# Altium footprint library Lib_Global.PcbLib: 96 footprints (part 6 of 6)
Each footprint in its own frame and in the unit in brackets; x right, y up, seen from the top. Pads: shape width x height; smd on the part's side, far side on the other; paste and mask are expansions set on the pad; w line width, h text height; cw(c..) or ccw(c..) is an arc to the next point about the centre after c.
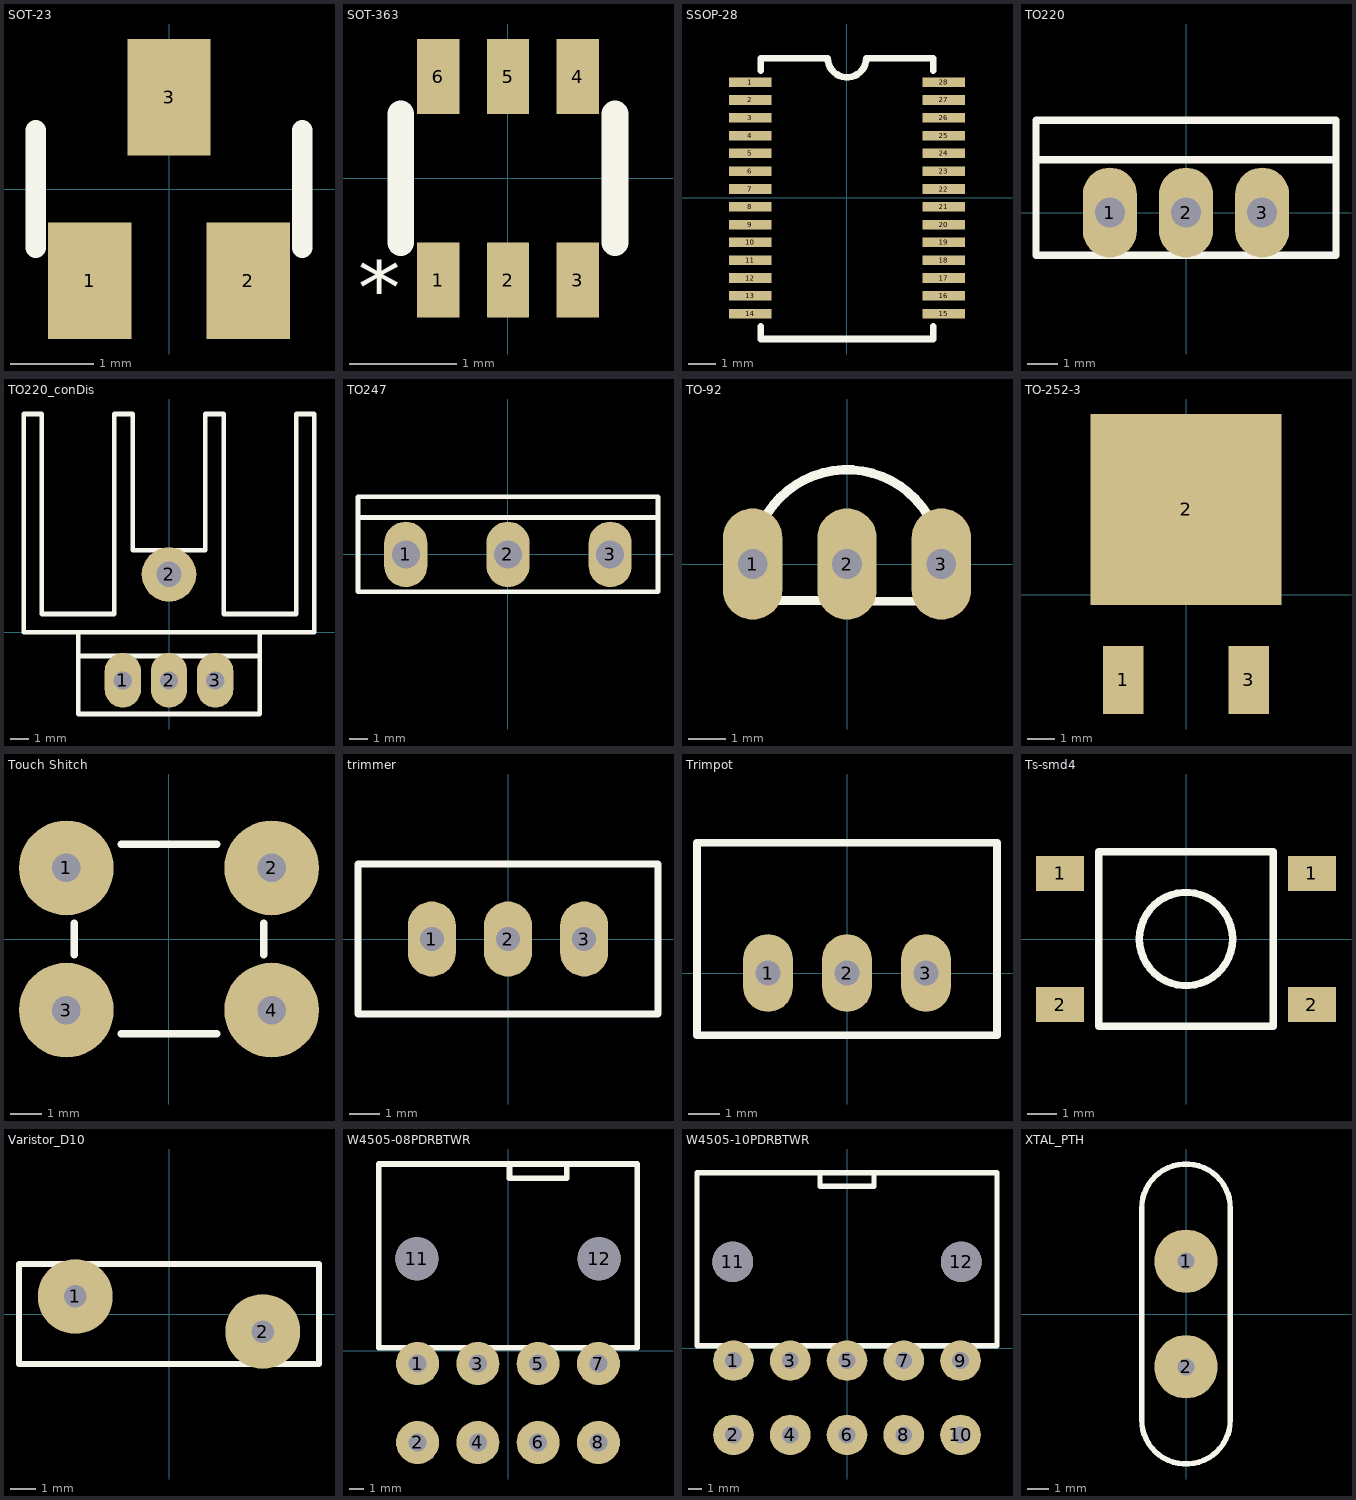
[diagram p5: the footprints below, top view; thin cyan lines are the x and y axes]

## SOT-23 [mm]
pads (3):
  rect 1x1.4 smd mask+0.2: 1(-0.95,-1.1) 2(0.95,-1.1) 3(0,1.1)
Top Overlay:
  lines w0.25: -1.6,-0.7 -1.6,0.7 ; 1.6,-0.7 1.6,0.7
3D body "CircuitWorks-SOT-23.SLDPRT": height 1.05, standoff -0.05, extent -1.5,-1.25 1.5,1.25

## SOT-363 [mm]
pads (6):
  rect 0.395x0.7 smd: 1(-0.65,-0.95) 2(0,-0.95) 3(0.65,-0.95) 4(0.65,0.95) 5(0,0.95) 6(-0.65,0.95)
Top Overlay:
  lines w0.25: -1,-0.6 -1,0.6 ; 1,-0.6 1,0.6
  text "*" at -1,-1.5 h1

## SSOP-28 [mm]
pads (28):
  rect 1.55x0.35 smd mask+0.102: 1(-3.525,4.225) 2(-3.525,3.575) 3(-3.525,2.925) 4(-3.525,2.275) 5(-3.525,1.625) 6(-3.525,0.975) 7(-3.525,0.325) 8(-3.525,-0.325) 9(-3.525,-0.975) 10(-3.525,-1.625) 11(-3.525,-2.275) 12(-3.525,-2.925) 13(-3.525,-3.575) 14(-3.525,-4.225) 15(3.525,-4.225) 16(3.525,-3.575) 17(3.525,-2.925) 18(3.525,-2.275) 19(3.525,-1.625) 20(3.525,-0.975) 21(3.525,-0.325) 22(3.525,0.325) 23(3.525,0.975) 24(3.525,1.625) 25(3.525,2.275) 26(3.525,2.925) 27(3.525,3.575) 28(3.525,4.225)
Top Overlay:
  lines w0.25: -3.15,-4.7 -3.15,-5.15 3.15,-5.15 3.15,-4.7 ; -3.15,4.65 -3.15,5.1 -0.7,5.1 ccw(c0,5.1) 0.7,5.1 3.15,5.1 3.15,4.65
  text "." at -3.325,4.775 h1.8

## TO220 [mm]
pads (3):
  oval 1.8x3 hole 1: 1(-2.54,0) 2(0,0) 3(2.54,0)
Top Overlay:
  lines w0.25: -5,1.765 5,1.765 ; -5,-1.425 -5,3.075 5,3.075 5,-1.425 -5,-1.425
3D body: height 29.5, standoff 0, extent 1.5,-5 1.5,-5
3D body "CircuitWorks-TO-220HS.SLDPRT": height 18.54, standoff -3.81, extent -5.08,-1.447 5.08,3.125

## TO220_conDis [mm]
pads (4):
  oval 2x3 hole 1: 1(-2.54,-2.65) 2(0,-2.65) 3(2.54,-2.65)
  round 3 hole 1.4: 2(0,3.175)
Top Overlay:
  lines w0.25: -5,-1.31 5,-1.31 ; -5,0 -5,-4.5 5,-4.5 5,0 ; -3,0 -8,0 ; -8,0 8,0 8,12 7,12 7,1 3,1 3,12 2,12 2,4.5 -2,4.5 -2,12 -3,12 -3,1 -7,1 -7,12 -8,12 -8,0
3D body "v7700w.SLDPRT": height 25, standoff -4.5, extent -8,0 8,16

## TO247 [mm]
pads (3):
  oval 2.3x3.5 hole 1.5: 1(-5.45,0) 2(0,0) 3(5.45,0)
Top Overlay:
  lines w0.25: -8,1.965 8,1.965 ; -8,-2 -8,3.075 8,3.075 8,-2 -8,-2
Mechanical 1:
  pour cut-out: -4.8,-4.1
3D body: height 29.5, standoff 0, extent 1.5,-5 1.5,-5
3D body: height 0.25, standoff 0, extent -8.1,-2.1 8.1,3.2

## TO-92 [mm]
pads (3):
  oval 1.6x3 hole 0.8: 1(-2.54,0) 2(0,0) 3(2.54,0)
Top Overlay:
  lines w0.25: -2.345,-0.977 cw(c0,0) 2.329,-1.013 -2.345,-0.977
3D body "User Library-TO-92-2.54-line-1_User Library-TO-92 Version2_TO-92 Part1.sldprt": height 10.7, standoff 6, extent -2.3,-1.76 2.4,2.17
3D body: height 6, standoff -2.7, extent -1.1,-1.8 -1.1,-1.8
3D body "User Library-TO-92-2.54-line-1_User Library-TO-92 Version2_TO-92 Part3.sldprt": height 6, standoff -2.7, extent -0.255,-0.24 0.255,0.24
3D body "User Library-TO-92-2.54-line-1_User Library-TO-92 Version2_TO-92 Part4.sldprt": height 6, standoff -2.7, extent -2.78,-0.24 -1,0.24
3D body "User Library-TO-92-2.54-line-1_User Library-TO-92 Version2_TO-92 Part5.sldprt": height 6, standoff -2.7, extent 1.1,-0.24 2.886,0.24

## TO-252-3 [mm]
pads (3):
  rect 1.5x2.5 smd: 1(-2.3,-3.125) 3(2.3,-3.125)
  rect 7x7 smd: 2(0,3.125)
3D body "User Library-TO-252-3.sldprt": height 2.41, standoff 0, extent -3.35,-3.902 3.35,6.45

## Touch Shitch [mm]
pads (4):
  round 3 hole 0.9: 1(-3.25,2.25) 2(3.25,2.25) 3(-3.25,-2.25) 4(3.25,-2.25)
Top Overlay:
  lines w0.25: -3,-0.5 -3,0.5 ; -1.5,-3 1.5,-3 ; -1.5,3 1.5,3 ; 3,-0.5 3,0.5
3D body "User Library-Panasonic-EVQPA-Pushbutton.sldprt": height 9.5, standoff -3.5, extent -4.106,-3 4.106,3

## trimmer [mm]
pads (3):
  oval 1.6x2.5 hole 0.8 mask+0.102: 1(-2.54,0) 2(0,0) 3(2.54,0)
Top Overlay:
  lines w0.25: -5,-2.5 -5,2.5 5,2.5 5,-2.5 -5,-2.5
3D body: height 0.25, standoff 0, extent -5.1,-2.6 5.1,2.6

## Trimpot [mm]
pads (3):
  oval 1.6x2.5 hole 0.8 mask+0.102: 1(-2.54,0) 2(0,0) 3(2.54,0)
Top Overlay:
  lines w0.25: -4.826,-2 -4.826,4.191 4.826,4.191 4.826,-2 -4.826,-2
3D body "User Library-3299W-1-103RLF.sldprt": height 11.56, standoff -6.22, extent -4.763,-1.905 4.763,4.191

## Ts-smd4 [mm]
pads (4):
  rect 1.65x1.2 smd mask+0.102: 1(-4.325,2.25) 1(4.325,2.25) 2(-4.325,-2.25) 2(4.325,-2.25)
Top Overlay:
  circle w0.254: c0,0 r1.6
  lines w0.25: -3,-3 3,-3 3,3 -3,3 -3,-3
3D body "User Library-PTS645SL50SMTR92-LFS_1.sldprt": height 3.15, standoff 0, extent -3,-3 3,3
3D body "User Library-PTS645SL43SMTR92-LFS_2.sldprt": height 3.45, standoff 3.15, extent -3,-3 3,3
3D body "User Library-PTS645SL43SMTR92-LFS_7.sldprt": height 3.75, standoff 3.45, extent -2.5,-2.5 -1.5,-1.5
3D body "User Library-PTS645SL43SMTR92-LFS_5.sldprt": height 1.3, standoff 0, extent -4.5,-2.608 -3,-1.908
3D body "User Library-PTS645SL43SMTR92-LFS_10.sldprt": height 3.75, standoff 3.45, extent -2.5,1.5 -1.5,2.5
3D body "User Library-PTS645SL43SMTR92-LFS_9.sldprt": height 3.75, standoff 3.45, extent 1.5,1.5 2.5,2.5
3D body "User Library-PTS645SL43SMTR92-LFS_8.sldprt": height 3.75, standoff 3.45, extent 1.5,-2.5 2.5,-1.5
3D body "User Library-PTS645SL43SMTR92-LFS_6.sldprt": height 1.3, standoff 0, extent 3,-2.608 4.5,-1.908
3D body "User Library-PTS645SL43SMTR92-LFS_4.sldprt": height 1.3, standoff 0, extent 3,1.892 4.5,2.592
3D body "User Library-PTS645SL43SMTR92-LFS_3.sldprt": height 1.3, standoff 0, extent -4.5,1.892 -3,2.592
3D body "User Library-PTS645SL43SMTR92-LFS_11.sldprt": height 4.3, standoff 3.45, extent -1.75,-1.75 1.75,1.75

## Varistor_D10 [mm]
pads (2):
  round 3 hole 0.9: 1(-3.75,0.7) 2(3.75,-0.7)
Top Overlay:
  lines w0.25: -6,-2 6,-2 6,2 -6,2 -6,-2
3D body "User Library-S10K275_1.sldprt": height 13, standoff -2.5, extent -5.999,-1.9 6,0
3D body "User Library-S10K275_2.sldprt": height 13, standoff -2.5, extent -6,0.002 5.999,1.902

## W4505-08PDRBTWR [mm]
pads (10):
  round 3 hole 1.25: 1(-6.3,-0.9) 2(-6.3,-6.4) 3(-2.1,-0.9) 4(-2.1,-6.4) 5(2.1,-0.9) 6(2.1,-6.4) 7(6.3,-0.9) 8(6.3,-6.4)
  round 3 hole 3: 11(-6.35,6.4) 12(6.35,6.4)
Top Overlay:
  lines w0.4: 0.1,13 0.1,12 4.1,12 4.1,13 ; -9,0.2 9,0.2 9,13 -9,13 -9,0.2

## W4505-10PDRBTWR [mm]
pads (12):
  round 3 hole 1.25: 1(-8.4,-0.9) 2(-8.4,-6.4) 3(-4.2,-0.9) 4(-4.2,-6.4) 5(0,-0.9) 6(0,-6.4) 7(4.2,-0.9) 8(4.2,-6.4) 9(8.4,-0.9) 10(8.4,-6.4)
  round 3 hole 3: 11(-8.45,6.4) 12(8.45,6.4)
Top Overlay:
  lines w0.4: -2,13 -2,12 2,12 2,13 ; -11.1,0.2 11.1,0.2 11.1,13 -11.1,13 -11.1,0.2

## XTAL_PTH [mm]
pads (2):
  round 3 hole 0.8 mask+0.2: 1(0,2.5) 2(0,-2.5)
Top Overlay:
  lines w0.25: -2.1,-5 -2.1,5 ; 2.1,-5 2.1,5
  lines w0.254: -2.1,-5 ccw(c0,-5) 2.1,-5 ; -2.1,5 cw(c0,5) 2.1,5
3D body "CircuitWorks-XTAL1.SLDPRT": height 11.68, standoff -2.54, extent -1.524,-5.294 1.524,5.374